# Altium footprint library PcbLib_jp.PcbLib: 178 footprints (part 3 of 12)
Each footprint in its own frame and in the unit in brackets; x right, y up, seen from the top. Pads: shape width x height; smd on the part's side, far side on the other; paste and mask are expansions set on the pad; w line width, h text height; cw(c..) or ccw(c..) is an arc to the next point about the centre after c.
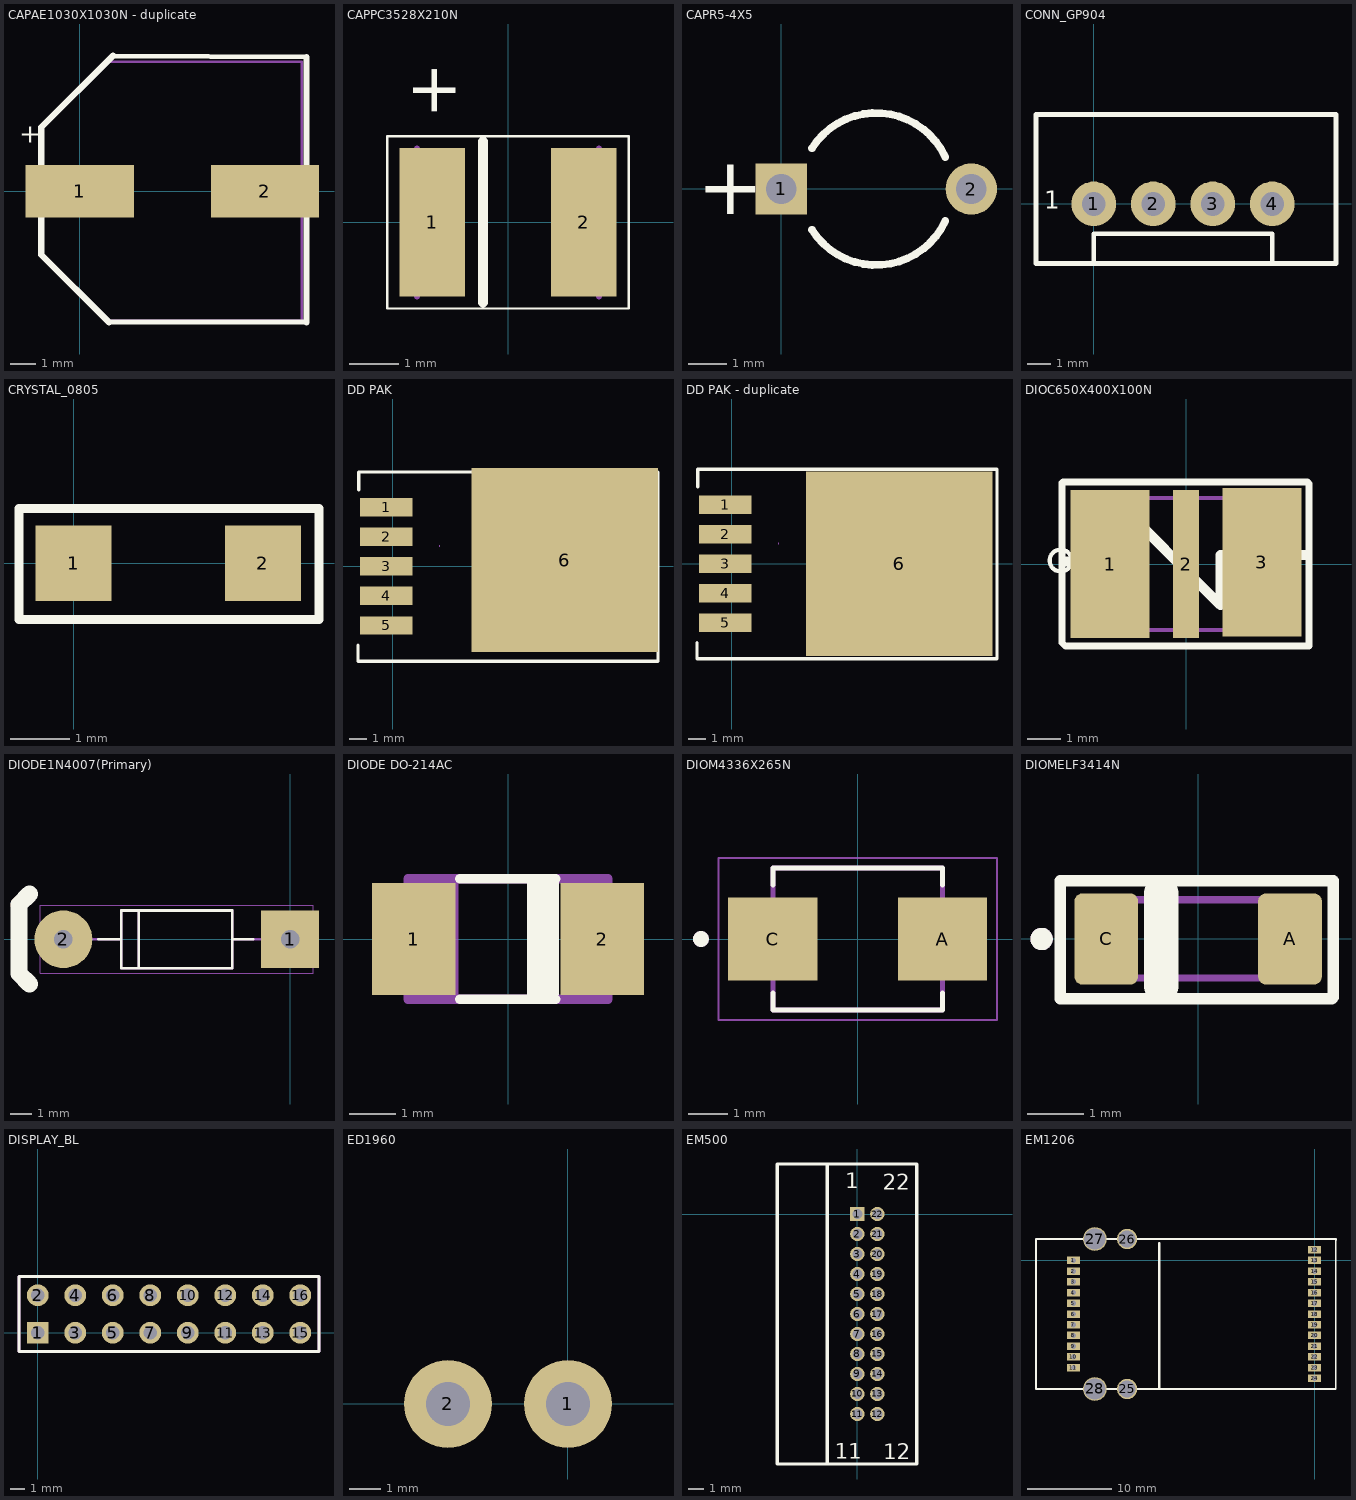
[diagram p2: the footprints below, top view; thin cyan lines are the x and y axes]

## CAPAE1030X1030N - duplicate [mm]
pads (2):
  rect 4.3x2.1 smd: 1(0,0) 2(7.366,0)
Top Overlay:
  lines w0.2: 1.165,-5.207 9.017,-5.207 ; 1.323,5.387 9.017,5.33
  lines w0.254: 1.165,-5.207 -1.524,-2.518 -1.524,-2.413 -1.524,2.54 1.323,5.387 ; 9.017,-5.207 9.017,5.33
  text "+" at -2.413,1.93 h0.76
Mechanical 13:
  lines w0.1: -1.467,-2.575 1.108,-5.15 8.833,-5.15 8.833,5.15 1.108,5.15 -1.467,2.575 -1.467,-2.575
3D body: height 10.41, standoff 0, extent -1.639,-4.997 9.361,5.403

## CAPPC3528X210N [mm]
pads (2):
  rect 1.34x3.02 smd: 1(-1.54,0) 2(1.54,0)
Top Overlay:
  lines w0.05: -2.458,-1.75 2.458,-1.75 2.458,1.75 -2.458,1.75 -2.458,-1.75
  lines w0.203: -0.51,-1.63 -0.51,1.65
  text "+" at -1.06,2.11 h1
Mechanical 13:
  lines w0.127: -1.85,-1.5 -1.85,1.5 ; 1.85,-1.5 1.85,1.5
3D body "T491B476K010AT.STEP": height 2.1, standoff 0, extent -1.79,-1.39 1.71,1.41

## CAPR5-4X5 [mm] "Capacitor; 2 Leads"
height 12
pads (2):
  rect 1.35x1.35 hole 0.8: 1(0,0)
  round 1.35 hole 0.8: 2(5,0)
Top Overlay:
  lines w0.2: 0.813,-1.075 ccw(c2.5,0) 4.319,-0.832 ; 0.813,1.075 cw(c2.5,0) 4.319,0.832
  text "+" at -2.21,-0.66 h1.52
3D body "CircuitWorks-ELECTROLITIC CAPACITOR RADIAL 8X12.STEP": height 17, standoff 2.5, extent -0.865,-4.127 7.135,3.873
3D body: height 2.95, standoff -2.95, extent 2.5,-2.921 5.04,-1.397

## CONN_GP904 [mil]
pads (4):
  round 75 / inner round 60 / far side round 75 hole 40: 1(0,0) 2(100,0) 3(200,0) 4(300,0)
Top Overlay:
  lines w8: 0,-100 0,-50 300,-50 300,-100 200,-100 ; -97,-100 407,-100 407,150 -97,150 -97,-100
  text "1" at -83,-8 h30
3D body "User Library-jst-b4b-xh-a-1.STEP": height 314.96, standoff -94.49, extent -89.1,-90.38 399.1,136

## CRYSTAL_0805 [mm]
height 3.5
pads (2):
  rect 1.27x1.27 smd: 1(0,0) 2(3.175,0)
Top Overlay:
  lines w0.152: -0.914,-0.94 -0.914,0.914 4.115,0.914 4.115,-0.94 -0.914,-0.94
3D body: height 1.5, standoff -0.04, extent 0,-0.6 3.2,0.6

## DD PAK [mil]
height 182.68
pads (6):
  rect 120x42 smd: 1(-15,135) 2(-15,67.5) 3(-15,0) 4(-15,-67.5) 5(-15,-135)
  rect 425x420 smd paste-50: 6(392,14)
Top Overlay:
  lines w7.87: -79.07,-180.13 -79.07,-216.13 605,-216.13 605,215 -77.27,215 -77.27,175
Mechanical 1:
  lines w1: 107.9,44.27 107.9,47.47
3D body "User Library-TO263-5S.STEP": height 204.04, standoff 15.07, extent -44.93,-194.85 572,198.85

## DD PAK - duplicate [mil]
pads (6):
  rect 120x42 smd: 1(-15,135) 2(-15,67.5) 3(-15,0) 4(-15,-67.5) 5(-15,-135)
  rect 425x420 smd: 6(382.5,0)
Top Overlay:
  lines w7.87: -79.07,-180.13 -79.07,-216.13 605,-216.13 605,215 -77.27,215 -77.27,175
Mechanical 1:
  lines w1: 107.9,44.27 107.9,47.47
3D body "User Library-TO-263BA-1.step": height 172.5, standoff -0.04, extent -42.99,-196.25 510,206.25

## DIOC650X400X100N [mm]
pads (3):
  rect 2.4x4.5 smd paste-3 mask+0: 1(-2.3,0) 3(2.3,0.05)
  rect 0.8x4.5 smd paste-3 mask+0: 2(0,0)
Top Overlay:
  circle w0.127: c-3.803,0.105 r0.333
  lines w0.203: -3.759,-2.388 -3.658,-2.489 3.734,-2.489 3.734,2.438 3.683,2.489 -3.734,2.489 -3.759,2.464 -3.759,-2.388
  lines w0.305: -3.658,0.076 -2.362,0.076 -2.286,0.152 -2.286,2.083 1.041,-1.245 1.041,0.279 3.607,0.279
Top Paste:
  region: -1.125,-1.677 -2.929,-1.677 -2.929,1.675 -1.125,1.675
  region: 0.375,-1.675 -0.375,-1.675 -0.375,1.675 0.375,1.675
  region: 2.925,-1.678 1.127,-1.678 1.127,1.675 2.925,1.675
Top Solder:
  region: 2.95,-1.701 1.101,-1.701 1.101,1.7 2.95,1.7
  region: -1.1,-1.701 -2.952,-1.701 -2.952,1.7 -1.1,1.7
  region: 0.4,-1.7 -0.4,-1.7 -0.4,1.7 0.4,1.7
Mechanical 13:
  lines w0.127: -3.25,-2 -3.25,2 3.25,2 3.25,-2 -3.25,-2
Mechanical 15:
  lines w0.05: -3.75,-2.5 -3.75,2.5 3.75,2.5 3.75,-2.5 -3.75,-2.5
3D body "User Library-TBU_DF(2).STEP": height 2.01, standoff 0.95, extent -3.427,-2.896 3.173,2.704

## DIODE1N4007(Primary) [mm]
pads (2):
  rect 2.7x2.7 hole 0.86: 1(0,0)
  round 2.7 hole 0.86: 2(-10.6,0)
Top Layer:
  lines w0.8: -12.675,1.6 -12.675,1.626 -12.675,1.6
Top Overlay:
  lines w0.127: -8.958,0 -7.9,0 ; -1.719,0 -2.7,0 ; -7.9,0 -7.9,1.35 -7.075,1.35 ; -7.9,0 -7.9,-1.35 -7.075,-1.35 ; -7.075,-1.35 -2.7,-1.35 -2.7,0 ; -7.075,-1.35 -7.075,1.35 ; -7.075,1.35 -2.7,1.35 -2.7,0
  lines w0.8: -12.675,1.6 -12.675,-1.6 -12.192,-2.083 ; -12.675,1.626 -12.192,2.108
Mechanical 13:
  lines w0.127: -7.9,-1.35 -7.075,-1.35 ; -7.9,-1.35 -7.9,0 ; -7.9,-1.35 -7.075,-1.35 ; -7.9,-1.35 -7.9,0 ; -7.9,0 -7.9,1.35 ; -7.9,0 -9.2,0 -7.9,0 ; -7.9,0 -7.9,1.35 ; -7.9,1.35 -7.075,1.35 ; -7.9,1.35 -7.075,1.35 ; -7.075,-1.35 -7.075,1.35 ; -7.075,-1.35 -2.7,-1.35 ; -7.075,-1.35 -2.7,-1.35 ; -7.075,-1.35 -7.075,1.35 ; -7.075,1.35 -2.7,1.35 ; -7.075,1.35 -2.7,1.35 ; -2.7,-1.35 -2.7,0 ; -2.7,-1.35 -2.7,0 ; -2.7,0 -2.7,1.35 ; -2.7,0 -1.4,0 -2.7,0 ; -2.7,0 -2.7,1.35
Mechanical 16:
  lines w0.05: -11.675,-1.6 1.075,-1.6 1.075,1.6 -11.675,1.6 -11.675,-1.6
3D body: height 0.25, standoff 0, extent -0.601,3.302 -0.601,3.302
3D body "User Library-1N4007 x7mm.STEP": height 6.31, standoff 1.1, extent -9.073,-1.437 -1.273,1.183

## DIODE DO-214AC [mm]
pads (2):
  rect 1.8x2.4 smd: 1(-2.025,0) 2(2.025,0)
Top Overlay:
  region: 1.092,-1.2 0.417,-1.2 0.417,1.251 1.092,1.251
  lines w0.203: -1.035,-1.3 1.025,-1.3 ; -1.035,1.3 1.025,1.3
Mechanical 13:
  region: -1.075,-1.226 -1.751,-1.226 -1.751,1.225 -1.075,1.225
  region: 2.825,-1.102 2.178,-1.102 2.178,1.1 2.825,1.1
  region: -2.175,-1.1 -2.826,-1.1 -2.826,1.1 -2.175,1.1
  lines w0.203: -2.15,-1.3 -2.15,1.3 2.15,1.3 2.15,-1.3 -2.15,-1.3
3D body "User Library-DO-214AC SMA.STEP": height 2, standoff -0.4, extent -2.6,-1.326 2.6,1.274
3D body: height 0.25, standoff 0, extent 0.483,-0.025 0.483,-0.025
3D body: height 0.25, standoff 0, extent 0.813,0 0.813,0

## DIOM4336X265N [mm]
pads (2):
  rect 2.28x2.12 smd: A(2.165,0) C(-2.165,0)
Top Overlay:
  circle w0.2: c-4,0 r0.1
  lines w0.127: -2.163,-1.38 -2.163,-1.813 2.163,-1.813 2.163,-1.38 ; -2.163,1.38 -2.163,1.813 2.163,1.813 2.163,1.38
Mechanical 13:
  circle w0.2: c-4,0 r0.1
  lines w0.127: -2.163,-1.813 2.163,-1.813 2.163,1.813 -2.163,1.813 -2.163,-1.813
Mechanical 15:
  lines w0.05: -3.555,-2.063 3.555,-2.063 3.555,2.063 -3.555,2.063 -3.555,-2.063
3D body "SS23.STEP": height 2.65, standoff 0, extent -2.7,-1.842 2.64,1.783

## DIOMELF3414N [mm]
pads (2):
  rrect25% 1.14x1.63 smd: A(1.64,0) C(-1.64,0)
Top Overlay:
  circle w0.2: c-2.795,0 r0.1
  lines w0.203: -2.464,-1.067 2.388,-1.067 2.413,-1.041 2.413,1.041 -2.464,1.041 -2.464,-1.067
  lines w0.61: -0.66,-0.838 -0.66,0.813
Mechanical 13:
  circle w0.2: c-2.795,0 r0.1
  lines w0.127: -1.7,-0.7 -1.7,0.7 1.7,0.7 1.7,-0.7 -1.7,-0.7
Mechanical 15:
  lines w0.05: -2.46,-1.065 -2.46,1.065 2.46,1.065 2.46,-1.065 -2.46,-1.065
3D body "FDLL4148.STEP": height 1.75, standoff 0.25, extent -1.725,-0.7 1.725,0.8

## DISPLAY_BL [mil]
pads (16):
  rect 58x58 / inner round 60 / far side rect 58x58 hole 37: 1(0,0)
  round 58 / inner round 60 / far side round 58 hole 37: 2(0,100) 3(100,0) 4(100,100) 5(200,0) 6(200,100) 7(300,0) 8(300,100) 9(400,0) 10(400,100) 11(500,0) 12(500,100) 13(600,0) 14(600,100) 15(700,0) 16(700,100)
Top Overlay:
  lines w8: -50,-50 750,-50 750,150 -50,150 -50,-50
Mechanical 1:
  lines w8: -50,-50 750,-50 750,150 -50,150 -50,-50
3D body "User Library-Header 2x8.STEP": height 372.44, standoff -125.59, extent -199.98,-125.19 900.01,237.02

## ED1960 [mil]
pads (2):
  round 110 / inner round 60 / far side round 110 hole 55 mask+10: 1(0,0) 2(-150,0)
Bottom Overlay:
  lines w7: -250,-75 100,-75 100,0 100,300 -250,300 -250,-75

## EM500 [mil]
pads (22):
  rect 36x35 / inner round 60 / far side rect 36x35 hole 25 mask+3: 1(0,0)
  oval 36x35 / inner round 60 / far side rect 36x35 hole 25 mask+3: 2(0,-50) 3(0,-100) 4(0,-150) 5(0,-200) 6(0,-250) 7(0,-300) 8(0,-350) 9(0,-400) 10(0,-450) 11(0,-500) 12(50,-500) 13(50,-450) 14(50,-400) 15(50,-350) 16(50,-300) 17(50,-250) 18(50,-200) 19(50,-150) 20(50,-100) 21(50,-50) 22(50,0)
Top Overlay:
  lines w8: -75,-625 -75,125 ; -200,-625 -200,-612.5 -200,125 148.42,125 148.42,-625 -200,-625
  text "22" at 64,61 h39.37
  text "1" at -30,64 h39.37
  text "11" at -57,-612 h39.37
  text "12" at 65,-613 h39.37
3D body "Tibbo Technology Inc-EM500.STEP": height 633.86, standoff -108.27, extent -161.97,-608.27 90,108.27
3D body: height 559.05, standoff 0, extent -200,125 -200,125

## EM1206 [mil]
pads (28):
  rect 60x35 hole 25: 1(-1125,0) 2(-1125,-50) 3(-1125,-100) 4(-1125,-150) 5(-1125,-200) 6(-1125,-250) 7(-1125,-300) 8(-1125,-350) 9(-1125,-400) 10(-1125,-450) 11(-1125,-500) 12(0,50) 13(0,0) 14(0,-50) 15(0,-100) 16(0,-150) 17(0,-200) 18(0,-250) 19(0,-300) 20(0,-350) 21(0,-400) 22(0,-450) 23(0,-500) 24(0,-550)
  round 94.47 hole 78.73: 25(-875,-600) 26(-875,100)
  round 110.23 hole 100: 27(-1025,100) 28(-1025,-600)
Top Overlay:
  lines w8: -1300,-600 -1300,100 100,100 98.42,86.53 98.42,-600 75,-600 -1300,-600
  lines w10: -725,-600 -725,80
  text ".Designator" at -920.47,-303.63 h56.25
  text ".Pattern" at -914.4,-216.33 h56.25
  text ".Comment" at -920.47,-388.6 h56.25
Mechanical 1:
  text ".Designator" at -906.53,-464.9 h56.25
3D body "Tibbo Technology Inc-EM1206+RJ203.STEP": height 633.46, standoff -260.06, extent -1307.58,-645.67 47.74,141.73